# Altium footprint library con-samtec.PCBLIB: 805 footprints (part 19 of 55)
Each footprint in its own frame and in the unit in brackets; x right, y up, seen from the top. Pads: shape width x height; smd on the part's side, far side on the other; paste and mask are expansions set on the pad; w line width, h text height; cw(c..) or ccw(c..) is an arc to the next point about the centre after c.
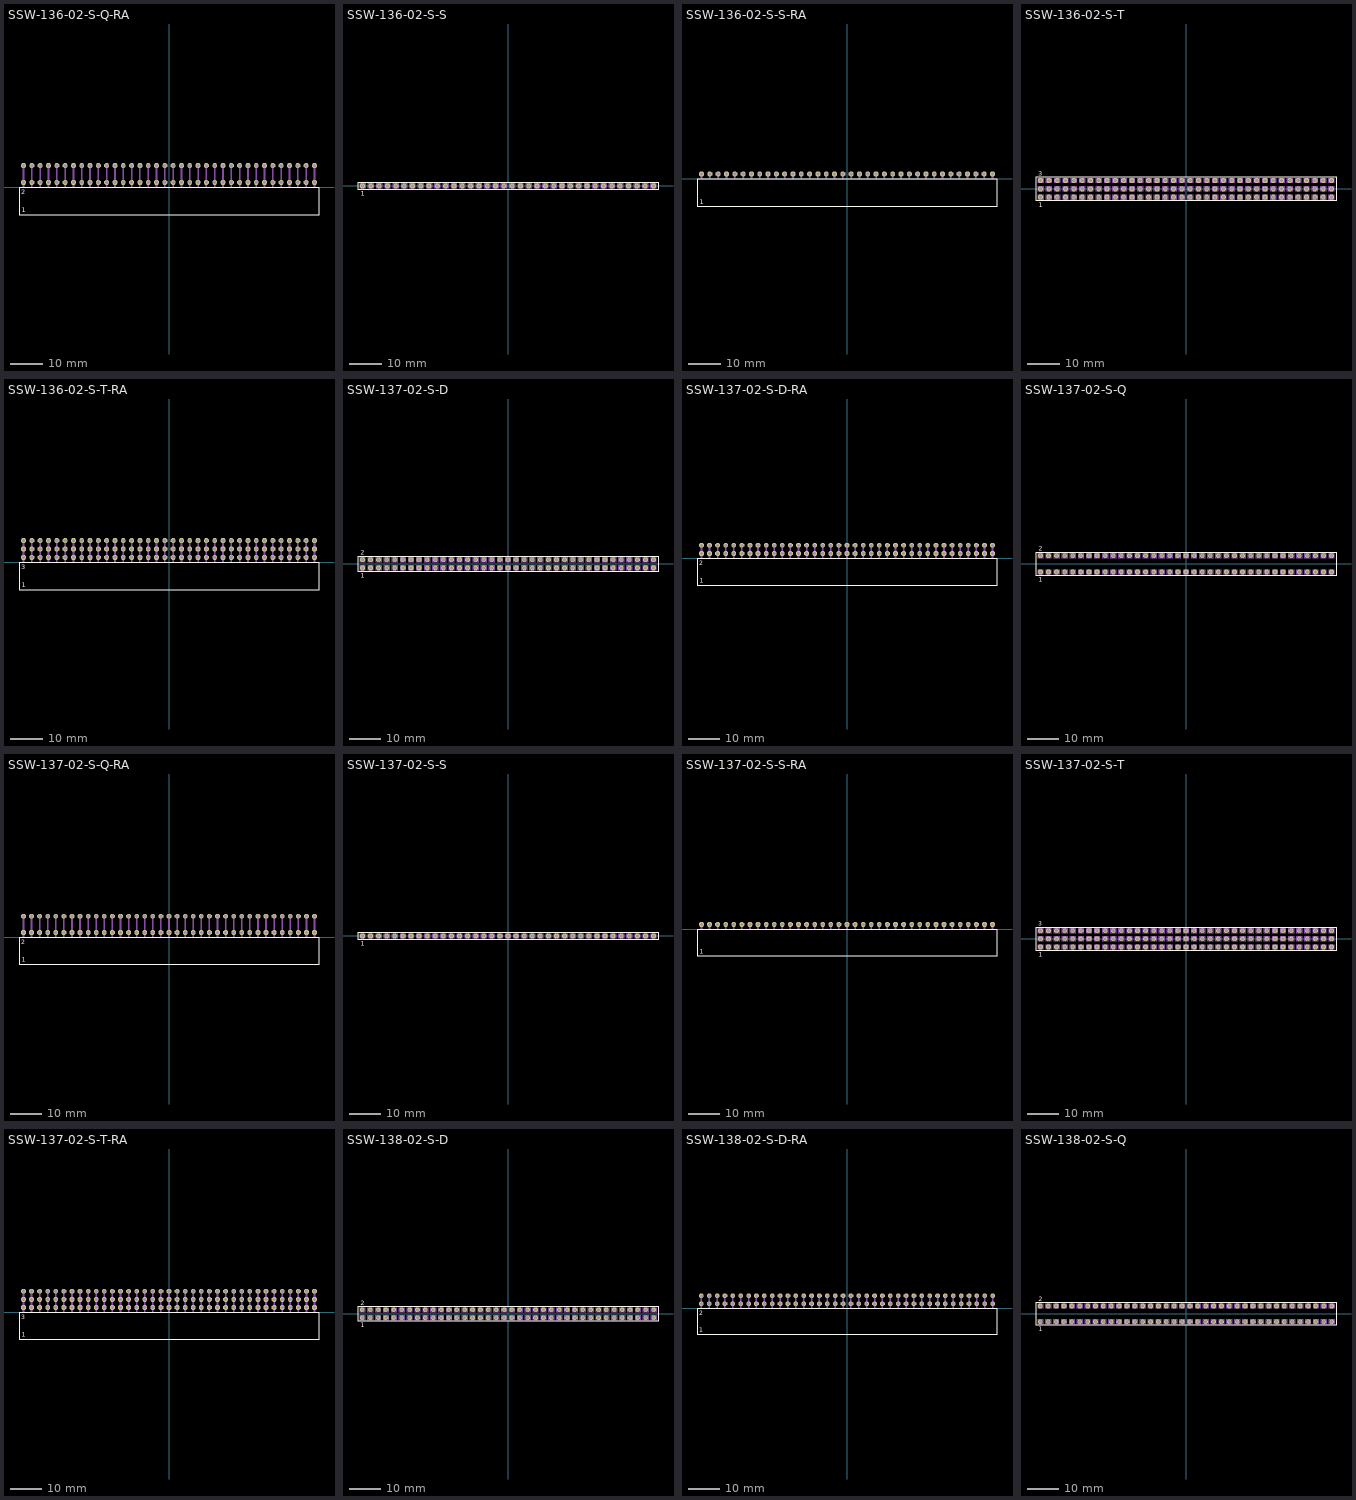
[diagram p18: the footprints below, top view; thin cyan lines are the x and y axes]

## SSW-136-02-S-Q-RA [mil]
pads (72):
  oct 59.06x59.06 hole 39.37: 1(-1750,60) 2(-1750,260) 3(-1650,60) 4(-1650,260) 5(-1550,60) 6(-1550,260) 7(-1450,60) 8(-1450,260) 9(-1350,60) 10(-1350,260) 11(-1250,60) 12(-1250,260) 13(-1150,60) 14(-1150,260) 15(-1050,60) 16(-1050,260) 17(-950,60) 18(-950,260) 19(-850,60) 20(-850,260) 21(-750,60) 22(-750,260) 23(-650,60) 24(-650,260) 25(-550,60) 26(-550,260) 27(-450,60) 28(-450,260) 29(-350,60) 30(-350,260) 31(-250,60) 32(-250,260) 33(-150,60) 34(-150,260) 35(-50,60) 36(-50,260) 37(50,60) 38(50,260) 39(150,60) 40(150,260) 41(250,60) 42(250,260) 43(350,60) 44(350,260) 45(450,60) 46(450,260) 47(550,60) 48(550,260) 49(650,60) 50(650,260) 51(750,60) 52(750,260) 53(850,60) 54(850,260) 55(950,60) 56(950,260) 57(1050,60) 58(1050,260) 59(1150,60) 60(1150,260) 61(1250,60) 62(1250,260) 63(1350,60) 64(1350,260) 65(1450,60) 66(1450,260) 67(1550,60) 68(1550,260) 69(1650,60) 70(1650,260) 71(1750,60) 72(1750,260)
Top Overlay:
  lines w8: -1805.08,-330.55 1805.08,-330.55 1805.08,-4.17 -1805.08,-4.17 -1805.08,-330.55
  text "1" at -1773.43,-301.18 h56.1
  text "2" at -1776.38,-86.61 h56.1
Mechanical 16:
  rectangle: -1760,0 -1740,270
  rectangle: -1660,0 -1640,270
  rectangle: -1560,0 -1540,270
  rectangle: -1460,0 -1440,270
  rectangle: -1360,0 -1340,270
  rectangle: -1260,0 -1240,270
  rectangle: -1160,0 -1140,270
  rectangle: -1060,0 -1040,270
  rectangle: -960,0 -940,270
  rectangle: -860,0 -840,270
  rectangle: -760,0 -740,270
  rectangle: -660,0 -640,270
  rectangle: -560,0 -540,270
  rectangle: -460,0 -440,270
  rectangle: -360,0 -340,270
  rectangle: -260,0 -240,270
  rectangle: -160,0 -140,270
  rectangle: -60,0 -40,270
  rectangle: 40,0 60,270
  rectangle: 140,0 160,270
  rectangle: 240,0 260,270
  rectangle: 340,0 360,270
  rectangle: 440,0 460,270
  rectangle: 540,0 560,270
  rectangle: 640,0 660,270
  rectangle: 740,0 760,270
  rectangle: 840,0 860,270
  rectangle: 940,0 960,270
  rectangle: 1040,0 1060,270
  rectangle: 1140,0 1160,270
  rectangle: 1240,0 1260,270
  rectangle: 1340,0 1360,270
  rectangle: 1440,0 1460,270
  rectangle: 1540,0 1560,270
  rectangle: 1640,0 1660,270
  rectangle: 1740,0 1760,270

## SSW-136-02-S-S [mm]
pads (36):
  oct 1.5x1.5 hole 1: 1(-44.45,0) 2(-41.91,0) 3(-39.37,0) 4(-36.83,0) 5(-34.29,0) 6(-31.75,0) 7(-29.21,0) 8(-26.67,0) 9(-24.13,0) 10(-21.59,0) 11(-19.05,0) 12(-16.51,0) 13(-13.97,0) 14(-11.43,0) 15(-8.89,0) 16(-6.35,0) 17(-3.81,0) 18(-1.27,0) 19(1.27,0) 20(3.81,0) 21(6.35,0) 22(8.89,0) 23(11.43,0) 24(13.97,0) 25(16.51,0) 26(19.05,0) 27(21.59,0) 28(24.13,0) 29(26.67,0) 30(29.21,0) 31(31.75,0) 32(34.29,0) 33(36.83,0) 34(39.37,0) 35(41.91,0) 36(44.45,0)
Top Overlay:
  lines w0.203: -45.849,-1.155 45.849,-1.155 45.849,1.155 -45.849,1.155 -45.849,-1.155
  text "1" at -44.958,-3.048 h1.42
Mechanical 16:
  lines w0.203: -45.195,-0.745 -43.695,-0.745 -43.695,0.755 -45.195,0.755 -45.195,-0.745 ; -42.655,-0.745 -41.155,-0.745 -41.155,0.755 -42.655,0.755 -42.655,-0.745 ; -40.115,-0.745 -38.615,-0.745 -38.615,0.755 -40.115,0.755 -40.115,-0.745 ; -37.575,-0.745 -36.075,-0.745 -36.075,0.755 -37.575,0.755 -37.575,-0.745 ; -35.035,-0.745 -33.535,-0.745 -33.535,0.755 -35.035,0.755 -35.035,-0.745 ; -32.495,-0.745 -30.995,-0.745 -30.995,0.755 -32.495,0.755 -32.495,-0.745 ; -29.955,-0.745 -28.455,-0.745 -28.455,0.755 -29.955,0.755 -29.955,-0.745 ; -27.415,-0.745 -25.915,-0.745 -25.915,0.755 -27.415,0.755 -27.415,-0.745 ; -24.875,-0.745 -23.375,-0.745 -23.375,0.755 -24.875,0.755 -24.875,-0.745 ; -22.335,-0.745 -20.835,-0.745 -20.835,0.755 -22.335,0.755 -22.335,-0.745 ; -19.795,-0.745 -18.295,-0.745 -18.295,0.755 -19.795,0.755 -19.795,-0.745 ; -17.255,-0.745 -15.755,-0.745 -15.755,0.755 -17.255,0.755 -17.255,-0.745 ; -14.715,-0.745 -13.215,-0.745 -13.215,0.755 -14.715,0.755 -14.715,-0.745 ; -12.175,-0.745 -10.675,-0.745 -10.675,0.755 -12.175,0.755 -12.175,-0.745 ; -9.635,-0.745 -8.135,-0.745 -8.135,0.755 -9.635,0.755 -9.635,-0.745 ; -7.095,-0.745 -5.595,-0.745 -5.595,0.755 -7.095,0.755 -7.095,-0.745 ; -4.555,-0.745 -3.055,-0.745 -3.055,0.755 -4.555,0.755 -4.555,-0.745 ; -2.015,-0.745 -0.515,-0.745 -0.515,0.755 -2.015,0.755 -2.015,-0.745 ; 0.525,-0.745 2.025,-0.745 2.025,0.755 0.525,0.755 0.525,-0.745 ; 3.065,-0.745 4.565,-0.745 4.565,0.755 3.065,0.755 3.065,-0.745 ; 5.605,-0.745 7.105,-0.745 7.105,0.755 5.605,0.755 5.605,-0.745 ; 8.145,-0.745 9.645,-0.745 9.645,0.755 8.145,0.755 8.145,-0.745 ; 10.685,-0.745 12.185,-0.745 12.185,0.755 10.685,0.755 10.685,-0.745 ; 13.225,-0.745 14.725,-0.745 14.725,0.755 13.225,0.755 13.225,-0.745 ; 15.765,-0.745 17.265,-0.745 17.265,0.755 15.765,0.755 15.765,-0.745 ; 18.305,-0.745 19.805,-0.745 19.805,0.755 18.305,0.755 18.305,-0.745 ; 20.845,-0.745 22.345,-0.745 22.345,0.755 20.845,0.755 20.845,-0.745 ; 23.385,-0.745 24.885,-0.745 24.885,0.755 23.385,0.755 23.385,-0.745 ; 25.925,-0.745 27.425,-0.745 27.425,0.755 25.925,0.755 25.925,-0.745 ; 28.465,-0.745 29.965,-0.745 29.965,0.755 28.465,0.755 28.465,-0.745 ; 31.005,-0.745 32.505,-0.745 32.505,0.755 31.005,0.755 31.005,-0.745 ; 33.545,-0.745 35.045,-0.745 35.045,0.755 33.545,0.755 33.545,-0.745 ; 36.085,-0.745 37.585,-0.745 37.585,0.755 36.085,0.755 36.085,-0.745 ; 38.625,-0.745 40.125,-0.745 40.125,0.755 38.625,0.755 38.625,-0.745 ; 41.165,-0.745 42.665,-0.745 42.665,0.755 41.165,0.755 41.165,-0.745 ; 43.705,-0.745 45.205,-0.745 45.205,0.755 43.705,0.755 43.705,-0.745

## SSW-136-02-S-S-RA [mil]
pads (36):
  oct 59.06x59.06 hole 39.37: 1(-1750,60) 2(-1650,60) 3(-1550,60) 4(-1450,60) 5(-1350,60) 6(-1250,60) 7(-1150,60) 8(-1050,60) 9(-950,60) 10(-850,60) 11(-750,60) 12(-650,60) 13(-550,60) 14(-450,60) 15(-350,60) 16(-250,60) 17(-150,60) 18(-50,60) 19(50,60) 20(150,60) 21(250,60) 22(350,60) 23(450,60) 24(550,60) 25(650,60) 26(750,60) 27(850,60) 28(950,60) 29(1050,60) 30(1150,60) 31(1250,60) 32(1350,60) 33(1450,60) 34(1550,60) 35(1650,60) 36(1750,60)
Top Overlay:
  lines w8: -1805.08,-330.55 1805.08,-330.55 1805.08,-4.17 -1805.08,-4.17 -1805.08,-330.55
  text "1" at -1773.43,-301.18 h56.1
Mechanical 16:
  rectangle: -1760,0 -1740,70
  rectangle: -1660,0 -1640,70
  rectangle: -1560,0 -1540,70
  rectangle: -1460,0 -1440,70
  rectangle: -1360,0 -1340,70
  rectangle: -1260,0 -1240,70
  rectangle: -1160,0 -1140,70
  rectangle: -1060,0 -1040,70
  rectangle: -960,0 -940,70
  rectangle: -860,0 -840,70
  rectangle: -760,0 -740,70
  rectangle: -660,0 -640,70
  rectangle: -560,0 -540,70
  rectangle: -460,0 -440,70
  rectangle: -360,0 -340,70
  rectangle: -260,0 -240,70
  rectangle: -160,0 -140,70
  rectangle: -60,0 -40,70
  rectangle: 40,0 60,70
  rectangle: 140,0 160,70
  rectangle: 240,0 260,70
  rectangle: 340,0 360,70
  rectangle: 440,0 460,70
  rectangle: 540,0 560,70
  rectangle: 640,0 660,70
  rectangle: 740,0 760,70
  rectangle: 840,0 860,70
  rectangle: 940,0 960,70
  rectangle: 1040,0 1060,70
  rectangle: 1140,0 1160,70
  rectangle: 1240,0 1260,70
  rectangle: 1340,0 1360,70
  rectangle: 1440,0 1460,70
  rectangle: 1540,0 1560,70
  rectangle: 1640,0 1660,70
  rectangle: 1740,0 1760,70

## SSW-136-02-S-T [mm]
pads (108):
  oct 1.5x1.5 hole 1: 1(-44.45,-2.54) 2(-44.45,0) 3(-44.45,2.54) 4(-41.91,-2.54) 5(-41.91,0) 6(-41.91,2.54) 7(-39.37,-2.54) 8(-39.37,0) 9(-39.37,2.54) 10(-36.83,-2.54) 11(-36.83,0) 12(-36.83,2.54) 13(-34.29,-2.54) 14(-34.29,0) 15(-34.29,2.54) 16(-31.75,-2.54) 17(-31.75,0) 18(-31.75,2.54) 19(-29.21,-2.54) 20(-29.21,0) 21(-29.21,2.54) 22(-26.67,-2.54) 23(-26.67,0) 24(-26.67,2.54) 25(-24.13,-2.54) 26(-24.13,0) 27(-24.13,2.54) 28(-21.59,-2.54) 29(-21.59,0) 30(-21.59,2.54) 31(-19.05,-2.54) 32(-19.05,0) 33(-19.05,2.54) 34(-16.51,-2.54) 35(-16.51,0) 36(-16.51,2.54) 37(-13.97,-2.54) 38(-13.97,0) 39(-13.97,2.54) 40(-11.43,-2.54) 41(-11.43,0) 42(-11.43,2.54) 43(-8.89,-2.54) 44(-8.89,0) 45(-8.89,2.54) 46(-6.35,-2.54) 47(-6.35,0) 48(-6.35,2.54) 49(-3.81,-2.54) 50(-3.81,0) 51(-3.81,2.54) 52(-1.27,-2.54) 53(-1.27,0) 54(-1.27,2.54) 55(1.27,-2.54) 56(1.27,0) 57(1.27,2.54) 58(3.81,-2.54) 59(3.81,0) 60(3.81,2.54) 61(6.35,-2.54) 62(6.35,0) 63(6.35,2.54) 64(8.89,-2.54) 65(8.89,0) 66(8.89,2.54) 67(11.43,-2.54) 68(11.43,0) 69(11.43,2.54) 70(13.97,-2.54) 71(13.97,0) 72(13.97,2.54) 73(16.51,-2.54) 74(16.51,0) 75(16.51,2.54) 76(19.05,-2.54) 77(19.05,0) 78(19.05,2.54) 79(21.59,-2.54) 80(21.59,0) 81(21.59,2.54) 82(24.13,-2.54) 83(24.13,0) 84(24.13,2.54) 85(26.67,-2.54) 86(26.67,0) 87(26.67,2.54) 88(29.21,-2.54) 89(29.21,0) 90(29.21,2.54) 91(31.75,-2.54) 92(31.75,0) 93(31.75,2.54) 94(34.29,-2.54) 95(34.29,0) 96(34.29,2.54) 97(36.83,-2.54) 98(36.83,0) 99(36.83,2.54) 100(39.37,-2.54) 101(39.37,0) 102(39.37,2.54) 103(41.91,-2.54) 104(41.91,0) 105(41.91,2.54) 106(44.45,-2.54) 107(44.45,0) 108(44.45,2.54)
Top Overlay:
  lines w0.203: -45.849,-3.695 45.849,-3.695 45.849,3.695 -45.849,3.695 -45.849,-3.695
  text "1" at -44.958,-5.588 h1.42
  text "3" at -45.212,4.064 h1.42
Mechanical 16:
  drawing of 432 lines, arcs and shapes, not listed

## SSW-136-02-S-T-RA [mil]
pads (108):
  oct 59.06x59.06 hole 39.37: 1(-1750,60) 2(-1750,160) 3(-1750,260) 4(-1650,60) 5(-1650,160) 6(-1650,260) 7(-1550,60) 8(-1550,160) 9(-1550,260) 10(-1450,60) 11(-1450,160) 12(-1450,260) 13(-1350,60) 14(-1350,160) 15(-1350,260) 16(-1250,60) 17(-1250,160) 18(-1250,260) 19(-1150,60) 20(-1150,160) 21(-1150,260) 22(-1050,60) 23(-1050,160) 24(-1050,260) 25(-950,60) 26(-950,160) 27(-950,260) 28(-850,60) 29(-850,160) 30(-850,260) 31(-750,60) 32(-750,160) 33(-750,260) 34(-650,60) 35(-650,160) 36(-650,260) 37(-550,60) 38(-550,160) 39(-550,260) 40(-450,60) 41(-450,160) 42(-450,260) 43(-350,60) 44(-350,160) 45(-350,260) 46(-250,60) 47(-250,160) 48(-250,260) 49(-150,60) 50(-150,160) 51(-150,260) 52(-50,60) 53(-50,160) 54(-50,260) 55(50,60) 56(50,160) 57(50,260) 58(150,60) 59(150,160) 60(150,260) 61(250,60) 62(250,160) 63(250,260) 64(350,60) 65(350,160) 66(350,260) 67(450,60) 68(450,160) 69(450,260) 70(550,60) 71(550,160) 72(550,260) 73(650,60) 74(650,160) 75(650,260) 76(750,60) 77(750,160) 78(750,260) 79(850,60) 80(850,160) 81(850,260) 82(950,60) 83(950,160) 84(950,260) 85(1050,60) 86(1050,160) 87(1050,260) 88(1150,60) 89(1150,160) 90(1150,260) 91(1250,60) 92(1250,160) 93(1250,260) 94(1350,60) 95(1350,160) 96(1350,260) 97(1450,60) 98(1450,160) 99(1450,260) 100(1550,60) 101(1550,160) 102(1550,260) 103(1650,60) 104(1650,160) 105(1650,260) 106(1750,60) 107(1750,160) 108(1750,260)
Top Overlay:
  lines w8: -1805.08,-330.55 1805.08,-330.55 1805.08,-4.17 -1805.08,-4.17 -1805.08,-330.55
  text "1" at -1773.43,-301.18 h56.1
  text "3" at -1776.38,-86.61 h56.1
Mechanical 16:
  rectangle: -1760,0 -1740,270
  rectangle: -1660,0 -1640,270
  rectangle: -1560,0 -1540,270
  rectangle: -1460,0 -1440,270
  rectangle: -1360,0 -1340,270
  rectangle: -1260,0 -1240,270
  rectangle: -1160,0 -1140,270
  rectangle: -1060,0 -1040,270
  rectangle: -960,0 -940,270
  rectangle: -860,0 -840,270
  rectangle: -760,0 -740,270
  rectangle: -660,0 -640,270
  rectangle: -560,0 -540,270
  rectangle: -460,0 -440,270
  rectangle: -360,0 -340,270
  rectangle: -260,0 -240,270
  rectangle: -160,0 -140,270
  rectangle: -60,0 -40,270
  rectangle: 40,0 60,270
  rectangle: 140,0 160,270
  rectangle: 240,0 260,270
  rectangle: 340,0 360,270
  rectangle: 440,0 460,270
  rectangle: 540,0 560,270
  rectangle: 640,0 660,270
  rectangle: 740,0 760,270
  rectangle: 840,0 860,270
  rectangle: 940,0 960,270
  rectangle: 1040,0 1060,270
  rectangle: 1140,0 1160,270
  rectangle: 1240,0 1260,270
  rectangle: 1340,0 1360,270
  rectangle: 1440,0 1460,270
  rectangle: 1540,0 1560,270
  rectangle: 1640,0 1660,270
  rectangle: 1740,0 1760,270

## SSW-137-02-S-D [mm]
pads (74):
  oct 1.5x1.5 hole 1: 1(-45.72,-1.27) 2(-45.72,1.27) 3(-43.18,-1.27) 4(-43.18,1.27) 5(-40.64,-1.27) 6(-40.64,1.27) 7(-38.1,-1.27) 8(-38.1,1.27) 9(-35.56,-1.27) 10(-35.56,1.27) 11(-33.02,-1.27) 12(-33.02,1.27) 13(-30.48,-1.27) 14(-30.48,1.27) 15(-27.94,-1.27) 16(-27.94,1.27) 17(-25.4,-1.27) 18(-25.4,1.27) 19(-22.86,-1.27) 20(-22.86,1.27) 21(-20.32,-1.27) 22(-20.32,1.27) 23(-17.78,-1.27) 24(-17.78,1.27) 25(-15.24,-1.27) 26(-15.24,1.27) 27(-12.7,-1.27) 28(-12.7,1.27) 29(-10.16,-1.27) 30(-10.16,1.27) 31(-7.62,-1.27) 32(-7.62,1.27) 33(-5.08,-1.27) 34(-5.08,1.27) 35(-2.54,-1.27) 36(-2.54,1.27) 37(0,-1.27) 38(0,1.27) 39(2.54,-1.27) 40(2.54,1.27) 41(5.08,-1.27) 42(5.08,1.27) 43(7.62,-1.27) 44(7.62,1.27) 45(10.16,-1.27) 46(10.16,1.27) 47(12.7,-1.27) 48(12.7,1.27) 49(15.24,-1.27) 50(15.24,1.27) 51(17.78,-1.27) 52(17.78,1.27) 53(20.32,-1.27) 54(20.32,1.27) 55(22.86,-1.27) 56(22.86,1.27) 57(25.4,-1.27) 58(25.4,1.27) 59(27.94,-1.27) 60(27.94,1.27) 61(30.48,-1.27) 62(30.48,1.27) 63(33.02,-1.27) 64(33.02,1.27) 65(35.56,-1.27) 66(35.56,1.27) 67(38.1,-1.27) 68(38.1,1.27) 69(40.64,-1.27) 70(40.64,1.27) 71(43.18,-1.27) 72(43.18,1.27) 73(45.72,-1.27) 74(45.72,1.27)
Top Overlay:
  lines w0.203: -47.119,-2.425 47.119,-2.425 47.119,2.425 -47.119,2.425 -47.119,-2.425
  text "1" at -46.228,-4.318 h1.42
  text "2" at -46.228,2.794 h1.42
Mechanical 16:
  drawing of 296 lines, arcs and shapes, not listed

## SSW-137-02-S-D-RA [mil]
pads (74):
  oct 59.06x59.06 hole 39.37: 1(-1800,60) 2(-1800,160) 3(-1700,60) 4(-1700,160) 5(-1600,60) 6(-1600,160) 7(-1500,60) 8(-1500,160) 9(-1400,60) 10(-1400,160) 11(-1300,60) 12(-1300,160) 13(-1200,60) 14(-1200,160) 15(-1100,60) 16(-1100,160) 17(-1000,60) 18(-1000,160) 19(-900,60) 20(-900,160) 21(-800,60) 22(-800,160) 23(-700,60) 24(-700,160) 25(-600,60) 26(-600,160) 27(-500,60) 28(-500,160) 29(-400,60) 30(-400,160) 31(-300,60) 32(-300,160) 33(-200,60) 34(-200,160) 35(-100,60) 36(-100,160) 37(0,60) 38(0,160) 39(100,60) 40(100,160) 41(200,60) 42(200,160) 43(300,60) 44(300,160) 45(400,60) 46(400,160) 47(500,60) 48(500,160) 49(600,60) 50(600,160) 51(700,60) 52(700,160) 53(800,60) 54(800,160) 55(900,60) 56(900,160) 57(1000,60) 58(1000,160) 59(1100,60) 60(1100,160) 61(1200,60) 62(1200,160) 63(1300,60) 64(1300,160) 65(1400,60) 66(1400,160) 67(1500,60) 68(1500,160) 69(1600,60) 70(1600,160) 71(1700,60) 72(1700,160) 73(1800,60) 74(1800,160)
Top Overlay:
  lines w8: -1855.08,-330.55 1855.08,-330.55 1855.08,-4.17 -1855.08,-4.17 -1855.08,-330.55
  text "1" at -1823.43,-301.18 h56.1
  text "2" at -1826.38,-86.61 h56.1
Mechanical 16:
  rectangle: -1810,0 -1790,170
  rectangle: -1710,0 -1690,170
  rectangle: -1610,0 -1590,170
  rectangle: -1510,0 -1490,170
  rectangle: -1410,0 -1390,170
  rectangle: -1310,0 -1290,170
  rectangle: -1210,0 -1190,170
  rectangle: -1110,0 -1090,170
  rectangle: -1010,0 -990,170
  rectangle: -910,0 -890,170
  rectangle: -810,0 -790,170
  rectangle: -710,0 -690,170
  rectangle: -610,0 -590,170
  rectangle: -510,0 -490,170
  rectangle: -410,0 -390,170
  rectangle: -310,0 -290,170
  rectangle: -210,0 -190,170
  rectangle: -110,0 -90,170
  rectangle: -10,0 10,170
  rectangle: 90,0 110,170
  rectangle: 190,0 210,170
  rectangle: 290,0 310,170
  rectangle: 390,0 410,170
  rectangle: 490,0 510,170
  rectangle: 590,0 610,170
  rectangle: 690,0 710,170
  rectangle: 790,0 810,170
  rectangle: 890,0 910,170
  rectangle: 990,0 1010,170
  rectangle: 1090,0 1110,170
  rectangle: 1190,0 1210,170
  rectangle: 1290,0 1310,170
  rectangle: 1390,0 1410,170
  rectangle: 1490,0 1510,170
  rectangle: 1590,0 1610,170
  rectangle: 1690,0 1710,170
  rectangle: 1790,0 1810,170

## SSW-137-02-S-Q [mm]
pads (74):
  oct 1.5x1.5 hole 1: 1(-45.72,-2.54) 2(-45.72,2.54) 3(-43.18,-2.54) 4(-43.18,2.54) 5(-40.64,-2.54) 6(-40.64,2.54) 7(-38.1,-2.54) 8(-38.1,2.54) 9(-35.56,-2.54) 10(-35.56,2.54) 11(-33.02,-2.54) 12(-33.02,2.54) 13(-30.48,-2.54) 14(-30.48,2.54) 15(-27.94,-2.54) 16(-27.94,2.54) 17(-25.4,-2.54) 18(-25.4,2.54) 19(-22.86,-2.54) 20(-22.86,2.54) 21(-20.32,-2.54) 22(-20.32,2.54) 23(-17.78,-2.54) 24(-17.78,2.54) 25(-15.24,-2.54) 26(-15.24,2.54) 27(-12.7,-2.54) 28(-12.7,2.54) 29(-10.16,-2.54) 30(-10.16,2.54) 31(-7.62,-2.54) 32(-7.62,2.54) 33(-5.08,-2.54) 34(-5.08,2.54) 35(-2.54,-2.54) 36(-2.54,2.54) 37(0,-2.54) 38(0,2.54) 39(2.54,-2.54) 40(2.54,2.54) 41(5.08,-2.54) 42(5.08,2.54) 43(7.62,-2.54) 44(7.62,2.54) 45(10.16,-2.54) 46(10.16,2.54) 47(12.7,-2.54) 48(12.7,2.54) 49(15.24,-2.54) 50(15.24,2.54) 51(17.78,-2.54) 52(17.78,2.54) 53(20.32,-2.54) 54(20.32,2.54) 55(22.86,-2.54) 56(22.86,2.54) 57(25.4,-2.54) 58(25.4,2.54) 59(27.94,-2.54) 60(27.94,2.54) 61(30.48,-2.54) 62(30.48,2.54) 63(33.02,-2.54) 64(33.02,2.54) 65(35.56,-2.54) 66(35.56,2.54) 67(38.1,-2.54) 68(38.1,2.54) 69(40.64,-2.54) 70(40.64,2.54) 71(43.18,-2.54) 72(43.18,2.54) 73(45.72,-2.54) 74(45.72,2.54)
Top Overlay:
  lines w0.203: -47.119,-3.695 47.119,-3.695 47.119,3.695 -47.119,3.695 -47.119,-3.695
  text "1" at -46.228,-5.588 h1.42
  text "2" at -46.228,4.064 h1.42
Mechanical 16:
  drawing of 296 lines, arcs and shapes, not listed

## SSW-137-02-S-Q-RA [mil]
pads (74):
  oct 59.06x59.06 hole 39.37: 1(-1800,60) 2(-1800,260) 3(-1700,60) 4(-1700,260) 5(-1600,60) 6(-1600,260) 7(-1500,60) 8(-1500,260) 9(-1400,60) 10(-1400,260) 11(-1300,60) 12(-1300,260) 13(-1200,60) 14(-1200,260) 15(-1100,60) 16(-1100,260) 17(-1000,60) 18(-1000,260) 19(-900,60) 20(-900,260) 21(-800,60) 22(-800,260) 23(-700,60) 24(-700,260) 25(-600,60) 26(-600,260) 27(-500,60) 28(-500,260) 29(-400,60) 30(-400,260) 31(-300,60) 32(-300,260) 33(-200,60) 34(-200,260) 35(-100,60) 36(-100,260) 37(0,60) 38(0,260) 39(100,60) 40(100,260) 41(200,60) 42(200,260) 43(300,60) 44(300,260) 45(400,60) 46(400,260) 47(500,60) 48(500,260) 49(600,60) 50(600,260) 51(700,60) 52(700,260) 53(800,60) 54(800,260) 55(900,60) 56(900,260) 57(1000,60) 58(1000,260) 59(1100,60) 60(1100,260) 61(1200,60) 62(1200,260) 63(1300,60) 64(1300,260) 65(1400,60) 66(1400,260) 67(1500,60) 68(1500,260) 69(1600,60) 70(1600,260) 71(1700,60) 72(1700,260) 73(1800,60) 74(1800,260)
Top Overlay:
  lines w8: -1855.08,-330.55 1855.08,-330.55 1855.08,-4.17 -1855.08,-4.17 -1855.08,-330.55
  text "1" at -1823.43,-301.18 h56.1
  text "2" at -1826.38,-86.61 h56.1
Mechanical 16:
  rectangle: -1810,0 -1790,270
  rectangle: -1710,0 -1690,270
  rectangle: -1610,0 -1590,270
  rectangle: -1510,0 -1490,270
  rectangle: -1410,0 -1390,270
  rectangle: -1310,0 -1290,270
  rectangle: -1210,0 -1190,270
  rectangle: -1110,0 -1090,270
  rectangle: -1010,0 -990,270
  rectangle: -910,0 -890,270
  rectangle: -810,0 -790,270
  rectangle: -710,0 -690,270
  rectangle: -610,0 -590,270
  rectangle: -510,0 -490,270
  rectangle: -410,0 -390,270
  rectangle: -310,0 -290,270
  rectangle: -210,0 -190,270
  rectangle: -110,0 -90,270
  rectangle: -10,0 10,270
  rectangle: 90,0 110,270
  rectangle: 190,0 210,270
  rectangle: 290,0 310,270
  rectangle: 390,0 410,270
  rectangle: 490,0 510,270
  rectangle: 590,0 610,270
  rectangle: 690,0 710,270
  rectangle: 790,0 810,270
  rectangle: 890,0 910,270
  rectangle: 990,0 1010,270
  rectangle: 1090,0 1110,270
  rectangle: 1190,0 1210,270
  rectangle: 1290,0 1310,270
  rectangle: 1390,0 1410,270
  rectangle: 1490,0 1510,270
  rectangle: 1590,0 1610,270
  rectangle: 1690,0 1710,270
  rectangle: 1790,0 1810,270

## SSW-137-02-S-S [mm]
pads (37):
  oct 1.5x1.5 hole 1: 1(-45.72,0) 2(-43.18,0) 3(-40.64,0) 4(-38.1,0) 5(-35.56,0) 6(-33.02,0) 7(-30.48,0) 8(-27.94,0) 9(-25.4,0) 10(-22.86,0) 11(-20.32,0) 12(-17.78,0) 13(-15.24,0) 14(-12.7,0) 15(-10.16,0) 16(-7.62,0) 17(-5.08,0) 18(-2.54,0) 19(0,0) 20(2.54,0) 21(5.08,0) 22(7.62,0) 23(10.16,0) 24(12.7,0) 25(15.24,0) 26(17.78,0) 27(20.32,0) 28(22.86,0) 29(25.4,0) 30(27.94,0) 31(30.48,0) 32(33.02,0) 33(35.56,0) 34(38.1,0) 35(40.64,0) 36(43.18,0) 37(45.72,0)
Top Overlay:
  lines w0.203: -47.119,-1.155 47.119,-1.155 47.119,1.155 -47.119,1.155 -47.119,-1.155
  text "1" at -46.228,-3.048 h1.42
Mechanical 16:
  lines w0.203: -46.465,-0.745 -44.965,-0.745 -44.965,0.755 -46.465,0.755 -46.465,-0.745 ; -43.925,-0.745 -42.425,-0.745 -42.425,0.755 -43.925,0.755 -43.925,-0.745 ; -41.385,-0.745 -39.885,-0.745 -39.885,0.755 -41.385,0.755 -41.385,-0.745 ; -38.845,-0.745 -37.345,-0.745 -37.345,0.755 -38.845,0.755 -38.845,-0.745 ; -36.305,-0.745 -34.805,-0.745 -34.805,0.755 -36.305,0.755 -36.305,-0.745 ; -33.765,-0.745 -32.265,-0.745 -32.265,0.755 -33.765,0.755 -33.765,-0.745 ; -31.225,-0.745 -29.725,-0.745 -29.725,0.755 -31.225,0.755 -31.225,-0.745 ; -28.685,-0.745 -27.185,-0.745 -27.185,0.755 -28.685,0.755 -28.685,-0.745 ; -26.145,-0.745 -24.645,-0.745 -24.645,0.755 -26.145,0.755 -26.145,-0.745 ; -23.605,-0.745 -22.105,-0.745 -22.105,0.755 -23.605,0.755 -23.605,-0.745 ; -21.065,-0.745 -19.565,-0.745 -19.565,0.755 -21.065,0.755 -21.065,-0.745 ; -18.525,-0.745 -17.025,-0.745 -17.025,0.755 -18.525,0.755 -18.525,-0.745 ; -15.985,-0.745 -14.485,-0.745 -14.485,0.755 -15.985,0.755 -15.985,-0.745 ; -13.445,-0.745 -11.945,-0.745 -11.945,0.755 -13.445,0.755 -13.445,-0.745 ; -10.905,-0.745 -9.405,-0.745 -9.405,0.755 -10.905,0.755 -10.905,-0.745 ; -8.365,-0.745 -6.865,-0.745 -6.865,0.755 -8.365,0.755 -8.365,-0.745 ; -5.825,-0.745 -4.325,-0.745 -4.325,0.755 -5.825,0.755 -5.825,-0.745 ; -3.285,-0.745 -1.785,-0.745 -1.785,0.755 -3.285,0.755 -3.285,-0.745 ; -0.745,-0.745 0.755,-0.745 0.755,0.755 -0.745,0.755 -0.745,-0.745 ; 1.795,-0.745 3.295,-0.745 3.295,0.755 1.795,0.755 1.795,-0.745 ; 4.335,-0.745 5.835,-0.745 5.835,0.755 4.335,0.755 4.335,-0.745 ; 6.875,-0.745 8.375,-0.745 8.375,0.755 6.875,0.755 6.875,-0.745 ; 9.415,-0.745 10.915,-0.745 10.915,0.755 9.415,0.755 9.415,-0.745 ; 11.955,-0.745 13.455,-0.745 13.455,0.755 11.955,0.755 11.955,-0.745 ; 14.495,-0.745 15.995,-0.745 15.995,0.755 14.495,0.755 14.495,-0.745 ; 17.035,-0.745 18.535,-0.745 18.535,0.755 17.035,0.755 17.035,-0.745 ; 19.575,-0.745 21.075,-0.745 21.075,0.755 19.575,0.755 19.575,-0.745 ; 22.115,-0.745 23.615,-0.745 23.615,0.755 22.115,0.755 22.115,-0.745 ; 24.655,-0.745 26.155,-0.745 26.155,0.755 24.655,0.755 24.655,-0.745 ; 27.195,-0.745 28.695,-0.745 28.695,0.755 27.195,0.755 27.195,-0.745 ; 29.735,-0.745 31.235,-0.745 31.235,0.755 29.735,0.755 29.735,-0.745 ; 32.275,-0.745 33.775,-0.745 33.775,0.755 32.275,0.755 32.275,-0.745 ; 34.815,-0.745 36.315,-0.745 36.315,0.755 34.815,0.755 34.815,-0.745 ; 37.355,-0.745 38.855,-0.745 38.855,0.755 37.355,0.755 37.355,-0.745 ; 39.895,-0.745 41.395,-0.745 41.395,0.755 39.895,0.755 39.895,-0.745 ; 42.435,-0.745 43.935,-0.745 43.935,0.755 42.435,0.755 42.435,-0.745 ; 44.975,-0.745 46.475,-0.745 46.475,0.755 44.975,0.755 44.975,-0.745

## SSW-137-02-S-S-RA [mil]
pads (37):
  oct 59.06x59.06 hole 39.37: 1(-1800,60) 2(-1700,60) 3(-1600,60) 4(-1500,60) 5(-1400,60) 6(-1300,60) 7(-1200,60) 8(-1100,60) 9(-1000,60) 10(-900,60) 11(-800,60) 12(-700,60) 13(-600,60) 14(-500,60) 15(-400,60) 16(-300,60) 17(-200,60) 18(-100,60) 19(0,60) 20(100,60) 21(200,60) 22(300,60) 23(400,60) 24(500,60) 25(600,60) 26(700,60) 27(800,60) 28(900,60) 29(1000,60) 30(1100,60) 31(1200,60) 32(1300,60) 33(1400,60) 34(1500,60) 35(1600,60) 36(1700,60) 37(1800,60)
Top Overlay:
  lines w8: -1855.08,-330.55 1855.08,-330.55 1855.08,-4.17 -1855.08,-4.17 -1855.08,-330.55
  text "1" at -1823.43,-301.18 h56.1
Mechanical 16:
  rectangle: -1810,0 -1790,70
  rectangle: -1710,0 -1690,70
  rectangle: -1610,0 -1590,70
  rectangle: -1510,0 -1490,70
  rectangle: -1410,0 -1390,70
  rectangle: -1310,0 -1290,70
  rectangle: -1210,0 -1190,70
  rectangle: -1110,0 -1090,70
  rectangle: -1010,0 -990,70
  rectangle: -910,0 -890,70
  rectangle: -810,0 -790,70
  rectangle: -710,0 -690,70
  rectangle: -610,0 -590,70
  rectangle: -510,0 -490,70
  rectangle: -410,0 -390,70
  rectangle: -310,0 -290,70
  rectangle: -210,0 -190,70
  rectangle: -110,0 -90,70
  rectangle: -10,0 10,70
  rectangle: 90,0 110,70
  rectangle: 190,0 210,70
  rectangle: 290,0 310,70
  rectangle: 390,0 410,70
  rectangle: 490,0 510,70
  rectangle: 590,0 610,70
  rectangle: 690,0 710,70
  rectangle: 790,0 810,70
  rectangle: 890,0 910,70
  rectangle: 990,0 1010,70
  rectangle: 1090,0 1110,70
  rectangle: 1190,0 1210,70
  rectangle: 1290,0 1310,70
  rectangle: 1390,0 1410,70
  rectangle: 1490,0 1510,70
  rectangle: 1590,0 1610,70
  rectangle: 1690,0 1710,70
  rectangle: 1790,0 1810,70

## SSW-137-02-S-T [mm]
pads (111):
  oct 1.5x1.5 hole 1: 1(-45.72,-2.54) 2(-45.72,0) 3(-45.72,2.54) 4(-43.18,-2.54) 5(-43.18,0) 6(-43.18,2.54) 7(-40.64,-2.54) 8(-40.64,0) 9(-40.64,2.54) 10(-38.1,-2.54) 11(-38.1,0) 12(-38.1,2.54) 13(-35.56,-2.54) 14(-35.56,0) 15(-35.56,2.54) 16(-33.02,-2.54) 17(-33.02,0) 18(-33.02,2.54) 19(-30.48,-2.54) 20(-30.48,0) 21(-30.48,2.54) 22(-27.94,-2.54) 23(-27.94,0) 24(-27.94,2.54) 25(-25.4,-2.54) 26(-25.4,0) 27(-25.4,2.54) 28(-22.86,-2.54) 29(-22.86,0) 30(-22.86,2.54) 31(-20.32,-2.54) 32(-20.32,0) 33(-20.32,2.54) 34(-17.78,-2.54) 35(-17.78,0) 36(-17.78,2.54) 37(-15.24,-2.54) 38(-15.24,0) 39(-15.24,2.54) 40(-12.7,-2.54) 41(-12.7,0) 42(-12.7,2.54) 43(-10.16,-2.54) 44(-10.16,0) 45(-10.16,2.54) 46(-7.62,-2.54) 47(-7.62,0) 48(-7.62,2.54) 49(-5.08,-2.54) 50(-5.08,0) 51(-5.08,2.54) 52(-2.54,-2.54) 53(-2.54,0) 54(-2.54,2.54) 55(0,-2.54) 56(0,0) 57(0,2.54) 58(2.54,-2.54) 59(2.54,0) 60(2.54,2.54) 61(5.08,-2.54) 62(5.08,0) 63(5.08,2.54) 64(7.62,-2.54) 65(7.62,0) 66(7.62,2.54) 67(10.16,-2.54) 68(10.16,0) 69(10.16,2.54) 70(12.7,-2.54) 71(12.7,0) 72(12.7,2.54) 73(15.24,-2.54) 74(15.24,0) 75(15.24,2.54) 76(17.78,-2.54) 77(17.78,0) 78(17.78,2.54) 79(20.32,-2.54) 80(20.32,0) 81(20.32,2.54) 82(22.86,-2.54) 83(22.86,0) 84(22.86,2.54) 85(25.4,-2.54) 86(25.4,0) 87(25.4,2.54) 88(27.94,-2.54) 89(27.94,0) 90(27.94,2.54) 91(30.48,-2.54) 92(30.48,0) 93(30.48,2.54) 94(33.02,-2.54) 95(33.02,0) 96(33.02,2.54) 97(35.56,-2.54) 98(35.56,0) 99(35.56,2.54) 100(38.1,-2.54) 101(38.1,0) 102(38.1,2.54) 103(40.64,-2.54) 104(40.64,0) 105(40.64,2.54) 106(43.18,-2.54) 107(43.18,0) 108(43.18,2.54) 109(45.72,-2.54) 110(45.72,0) 111(45.72,2.54)
Top Overlay:
  lines w0.203: -47.119,-3.695 47.119,-3.695 47.119,3.695 -47.119,3.695 -47.119,-3.695
  text "1" at -46.228,-5.588 h1.42
  text "3" at -46.482,4.064 h1.42
Mechanical 16:
  drawing of 444 lines, arcs and shapes, not listed

## SSW-137-02-S-T-RA [mil]
pads (111):
  oct 59.06x59.06 hole 39.37: 1(-1800,60) 2(-1800,160) 3(-1800,260) 4(-1700,60) 5(-1700,160) 6(-1700,260) 7(-1600,60) 8(-1600,160) 9(-1600,260) 10(-1500,60) 11(-1500,160) 12(-1500,260) 13(-1400,60) 14(-1400,160) 15(-1400,260) 16(-1300,60) 17(-1300,160) 18(-1300,260) 19(-1200,60) 20(-1200,160) 21(-1200,260) 22(-1100,60) 23(-1100,160) 24(-1100,260) 25(-1000,60) 26(-1000,160) 27(-1000,260) 28(-900,60) 29(-900,160) 30(-900,260) 31(-800,60) 32(-800,160) 33(-800,260) 34(-700,60) 35(-700,160) 36(-700,260) 37(-600,60) 38(-600,160) 39(-600,260) 40(-500,60) 41(-500,160) 42(-500,260) 43(-400,60) 44(-400,160) 45(-400,260) 46(-300,60) 47(-300,160) 48(-300,260) 49(-200,60) 50(-200,160) 51(-200,260) 52(-100,60) 53(-100,160) 54(-100,260) 55(0,60) 56(0,160) 57(0,260) 58(100,60) 59(100,160) 60(100,260) 61(200,60) 62(200,160) 63(200,260) 64(300,60) 65(300,160) 66(300,260) 67(400,60) 68(400,160) 69(400,260) 70(500,60) 71(500,160) 72(500,260) 73(600,60) 74(600,160) 75(600,260) 76(700,60) 77(700,160) 78(700,260) 79(800,60) 80(800,160) 81(800,260) 82(900,60) 83(900,160) 84(900,260) 85(1000,60) 86(1000,160) 87(1000,260) 88(1100,60) 89(1100,160) 90(1100,260) 91(1200,60) 92(1200,160) 93(1200,260) 94(1300,60) 95(1300,160) 96(1300,260) 97(1400,60) 98(1400,160) 99(1400,260) 100(1500,60) 101(1500,160) 102(1500,260) 103(1600,60) 104(1600,160) 105(1600,260) 106(1700,60) 107(1700,160) 108(1700,260) 109(1800,60) 110(1800,160) 111(1800,260)
Top Overlay:
  lines w8: -1855.08,-330.55 1855.08,-330.55 1855.08,-4.17 -1855.08,-4.17 -1855.08,-330.55
  text "1" at -1823.43,-301.18 h56.1
  text "3" at -1826.38,-86.61 h56.1
Mechanical 16:
  rectangle: -1810,0 -1790,270
  rectangle: -1710,0 -1690,270
  rectangle: -1610,0 -1590,270
  rectangle: -1510,0 -1490,270
  rectangle: -1410,0 -1390,270
  rectangle: -1310,0 -1290,270
  rectangle: -1210,0 -1190,270
  rectangle: -1110,0 -1090,270
  rectangle: -1010,0 -990,270
  rectangle: -910,0 -890,270
  rectangle: -810,0 -790,270
  rectangle: -710,0 -690,270
  rectangle: -610,0 -590,270
  rectangle: -510,0 -490,270
  rectangle: -410,0 -390,270
  rectangle: -310,0 -290,270
  rectangle: -210,0 -190,270
  rectangle: -110,0 -90,270
  rectangle: -10,0 10,270
  rectangle: 90,0 110,270
  rectangle: 190,0 210,270
  rectangle: 290,0 310,270
  rectangle: 390,0 410,270
  rectangle: 490,0 510,270
  rectangle: 590,0 610,270
  rectangle: 690,0 710,270
  rectangle: 790,0 810,270
  rectangle: 890,0 910,270
  rectangle: 990,0 1010,270
  rectangle: 1090,0 1110,270
  rectangle: 1190,0 1210,270
  rectangle: 1290,0 1310,270
  rectangle: 1390,0 1410,270
  rectangle: 1490,0 1510,270
  rectangle: 1590,0 1610,270
  rectangle: 1690,0 1710,270
  rectangle: 1790,0 1810,270

## SSW-138-02-S-D [mm]
pads (76):
  oct 1.5x1.5 hole 1: 1(-46.99,-1.27) 2(-46.99,1.27) 3(-44.45,-1.27) 4(-44.45,1.27) 5(-41.91,-1.27) 6(-41.91,1.27) 7(-39.37,-1.27) 8(-39.37,1.27) 9(-36.83,-1.27) 10(-36.83,1.27) 11(-34.29,-1.27) 12(-34.29,1.27) 13(-31.75,-1.27) 14(-31.75,1.27) 15(-29.21,-1.27) 16(-29.21,1.27) 17(-26.67,-1.27) 18(-26.67,1.27) 19(-24.13,-1.27) 20(-24.13,1.27) 21(-21.59,-1.27) 22(-21.59,1.27) 23(-19.05,-1.27) 24(-19.05,1.27) 25(-16.51,-1.27) 26(-16.51,1.27) 27(-13.97,-1.27) 28(-13.97,1.27) 29(-11.43,-1.27) 30(-11.43,1.27) 31(-8.89,-1.27) 32(-8.89,1.27) 33(-6.35,-1.27) 34(-6.35,1.27) 35(-3.81,-1.27) 36(-3.81,1.27) 37(-1.27,-1.27) 38(-1.27,1.27) 39(1.27,-1.27) 40(1.27,1.27) 41(3.81,-1.27) 42(3.81,1.27) 43(6.35,-1.27) 44(6.35,1.27) 45(8.89,-1.27) 46(8.89,1.27) 47(11.43,-1.27) 48(11.43,1.27) 49(13.97,-1.27) 50(13.97,1.27) 51(16.51,-1.27) 52(16.51,1.27) 53(19.05,-1.27) 54(19.05,1.27) 55(21.59,-1.27) 56(21.59,1.27) 57(24.13,-1.27) 58(24.13,1.27) 59(26.67,-1.27) 60(26.67,1.27) 61(29.21,-1.27) 62(29.21,1.27) 63(31.75,-1.27) 64(31.75,1.27) 65(34.29,-1.27) 66(34.29,1.27) 67(36.83,-1.27) 68(36.83,1.27) 69(39.37,-1.27) 70(39.37,1.27) 71(41.91,-1.27) 72(41.91,1.27) 73(44.45,-1.27) 74(44.45,1.27) 75(46.99,-1.27) 76(46.99,1.27)
Top Overlay:
  lines w0.203: -48.389,-2.425 48.389,-2.425 48.389,2.425 -48.389,2.425 -48.389,-2.425
  text "1" at -47.498,-4.318 h1.42
  text "2" at -47.498,2.794 h1.42
Mechanical 16:
  drawing of 304 lines, arcs and shapes, not listed

## SSW-138-02-S-D-RA [mil]
pads (76):
  oct 59.06x59.06 hole 39.37: 1(-1850,60) 2(-1850,160) 3(-1750,60) 4(-1750,160) 5(-1650,60) 6(-1650,160) 7(-1550,60) 8(-1550,160) 9(-1450,60) 10(-1450,160) 11(-1350,60) 12(-1350,160) 13(-1250,60) 14(-1250,160) 15(-1150,60) 16(-1150,160) 17(-1050,60) 18(-1050,160) 19(-950,60) 20(-950,160) 21(-850,60) 22(-850,160) 23(-750,60) 24(-750,160) 25(-650,60) 26(-650,160) 27(-550,60) 28(-550,160) 29(-450,60) 30(-450,160) 31(-350,60) 32(-350,160) 33(-250,60) 34(-250,160) 35(-150,60) 36(-150,160) 37(-50,60) 38(-50,160) 39(50,60) 40(50,160) 41(150,60) 42(150,160) 43(250,60) 44(250,160) 45(350,60) 46(350,160) 47(450,60) 48(450,160) 49(550,60) 50(550,160) 51(650,60) 52(650,160) 53(750,60) 54(750,160) 55(850,60) 56(850,160) 57(950,60) 58(950,160) 59(1050,60) 60(1050,160) 61(1150,60) 62(1150,160) 63(1250,60) 64(1250,160) 65(1350,60) 66(1350,160) 67(1450,60) 68(1450,160) 69(1550,60) 70(1550,160) 71(1650,60) 72(1650,160) 73(1750,60) 74(1750,160) 75(1850,60) 76(1850,160)
Top Overlay:
  lines w8: -1905.08,-330.55 1905.08,-330.55 1905.08,-4.17 -1905.08,-4.17 -1905.08,-330.55
  text "1" at -1873.43,-301.18 h56.1
  text "2" at -1876.38,-86.61 h56.1
Mechanical 16:
  rectangle: -1860,0 -1840,170
  rectangle: -1760,0 -1740,170
  rectangle: -1660,0 -1640,170
  rectangle: -1560,0 -1540,170
  rectangle: -1460,0 -1440,170
  rectangle: -1360,0 -1340,170
  rectangle: -1260,0 -1240,170
  rectangle: -1160,0 -1140,170
  rectangle: -1060,0 -1040,170
  rectangle: -960,0 -940,170
  rectangle: -860,0 -840,170
  rectangle: -760,0 -740,170
  rectangle: -660,0 -640,170
  rectangle: -560,0 -540,170
  rectangle: -460,0 -440,170
  rectangle: -360,0 -340,170
  rectangle: -260,0 -240,170
  rectangle: -160,0 -140,170
  rectangle: -60,0 -40,170
  rectangle: 40,0 60,170
  rectangle: 140,0 160,170
  rectangle: 240,0 260,170
  rectangle: 340,0 360,170
  rectangle: 440,0 460,170
  rectangle: 540,0 560,170
  rectangle: 640,0 660,170
  rectangle: 740,0 760,170
  rectangle: 840,0 860,170
  rectangle: 940,0 960,170
  rectangle: 1040,0 1060,170
  rectangle: 1140,0 1160,170
  rectangle: 1240,0 1260,170
  rectangle: 1340,0 1360,170
  rectangle: 1440,0 1460,170
  rectangle: 1540,0 1560,170
  rectangle: 1640,0 1660,170
  rectangle: 1740,0 1760,170
  rectangle: 1840,0 1860,170

## SSW-138-02-S-Q [mm]
pads (76):
  oct 1.5x1.5 hole 1: 1(-46.99,-2.54) 2(-46.99,2.54) 3(-44.45,-2.54) 4(-44.45,2.54) 5(-41.91,-2.54) 6(-41.91,2.54) 7(-39.37,-2.54) 8(-39.37,2.54) 9(-36.83,-2.54) 10(-36.83,2.54) 11(-34.29,-2.54) 12(-34.29,2.54) 13(-31.75,-2.54) 14(-31.75,2.54) 15(-29.21,-2.54) 16(-29.21,2.54) 17(-26.67,-2.54) 18(-26.67,2.54) 19(-24.13,-2.54) 20(-24.13,2.54) 21(-21.59,-2.54) 22(-21.59,2.54) 23(-19.05,-2.54) 24(-19.05,2.54) 25(-16.51,-2.54) 26(-16.51,2.54) 27(-13.97,-2.54) 28(-13.97,2.54) 29(-11.43,-2.54) 30(-11.43,2.54) 31(-8.89,-2.54) 32(-8.89,2.54) 33(-6.35,-2.54) 34(-6.35,2.54) 35(-3.81,-2.54) 36(-3.81,2.54) 37(-1.27,-2.54) 38(-1.27,2.54) 39(1.27,-2.54) 40(1.27,2.54) 41(3.81,-2.54) 42(3.81,2.54) 43(6.35,-2.54) 44(6.35,2.54) 45(8.89,-2.54) 46(8.89,2.54) 47(11.43,-2.54) 48(11.43,2.54) 49(13.97,-2.54) 50(13.97,2.54) 51(16.51,-2.54) 52(16.51,2.54) 53(19.05,-2.54) 54(19.05,2.54) 55(21.59,-2.54) 56(21.59,2.54) 57(24.13,-2.54) 58(24.13,2.54) 59(26.67,-2.54) 60(26.67,2.54) 61(29.21,-2.54) 62(29.21,2.54) 63(31.75,-2.54) 64(31.75,2.54) 65(34.29,-2.54) 66(34.29,2.54) 67(36.83,-2.54) 68(36.83,2.54) 69(39.37,-2.54) 70(39.37,2.54) 71(41.91,-2.54) 72(41.91,2.54) 73(44.45,-2.54) 74(44.45,2.54) 75(46.99,-2.54) 76(46.99,2.54)
Top Overlay:
  lines w0.203: -48.389,-3.695 48.389,-3.695 48.389,3.695 -48.389,3.695 -48.389,-3.695
  text "1" at -47.498,-5.588 h1.42
  text "2" at -47.498,4.064 h1.42
Mechanical 16:
  drawing of 304 lines, arcs and shapes, not listed